# Altium footprint library IC.PcbLib: 386 footprints (part 11 of 30)
Each footprint in its own frame and in the unit in brackets; x right, y up, seen from the top. Pads: shape width x height; smd on the part's side, far side on the other; paste and mask are expansions set on the pad; w line width, h text height; cw(c..) or ccw(c..) is an arc to the next point about the centre after c.
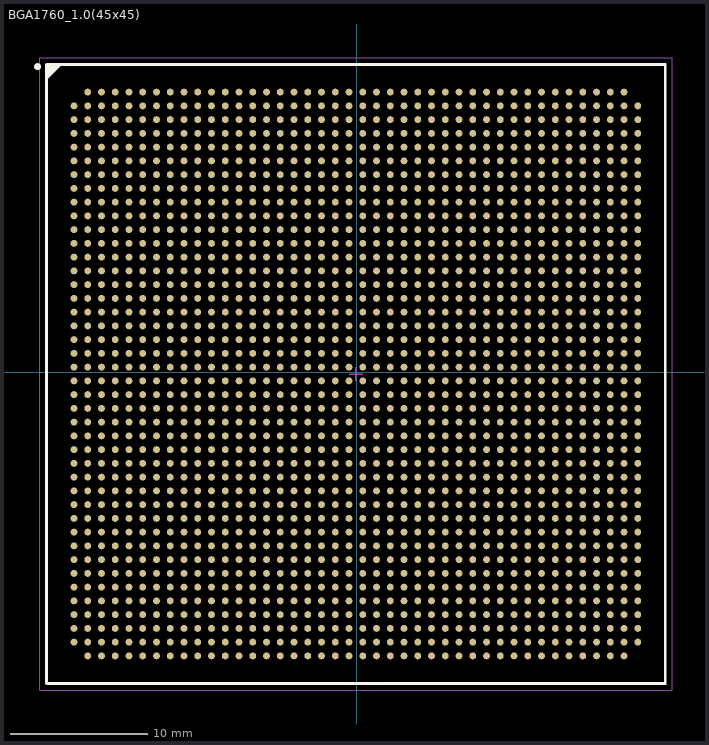
[diagram p10: the footprint, top view; thin cyan lines are the x and y axes]

## BGA1760_1.0(45x45) [mm]
height 0.65
pads (1760):
  round 0.5 smd: A2(-19.551,20.373) A3(-18.551,20.373) A4(-17.551,20.373) A5(-16.551,20.373) A6(-15.551,20.373) A7(-14.551,20.373) A8(-13.551,20.373) A9(-12.551,20.373) A10(-11.551,20.373) A11(-10.551,20.373) A12(-9.551,20.373) A13(-8.551,20.373) A14(-7.551,20.373) A15(-6.551,20.373) A16(-5.551,20.373) A17(-4.551,20.373) A18(-3.551,20.373) A19(-2.551,20.373) A20(-1.551,20.373) A21(-0.551,20.373) A22(0.449,20.373) A23(1.449,20.373) A24(2.449,20.373) A25(3.449,20.373) A26(4.449,20.373) A27(5.449,20.373) A28(6.449,20.373) A29(7.449,20.373) A30(8.449,20.373) A31(9.449,20.373) A32(10.449,20.373) A33(11.449,20.373) A34(12.449,20.373) A35(13.449,20.373) A36(14.449,20.373) A37(15.449,20.373) A38(16.449,20.373) A39(17.449,20.373) A40(18.449,20.373) A41(19.449,20.373) AA1(-20.551,0.373) AA2(-19.551,0.373) AA3(-18.551,0.373) AA4(-17.551,0.373) AA5(-16.551,0.373) AA6(-15.551,0.373) AA7(-14.551,0.373) AA8(-13.551,0.373) AA9(-12.551,0.373) AA10(-11.551,0.373) AA11(-10.551,0.373) AA12(-9.551,0.373) AA13(-8.551,0.373) AA14(-7.551,0.373) AA15(-6.551,0.373) AA16(-5.551,0.373) AA17(-4.551,0.373) AA18(-3.551,0.373) AA19(-2.551,0.373) AA20(-1.551,0.373) AA21(-0.551,0.373) AA22(0.449,0.373) AA23(1.449,0.373) AA24(2.449,0.373) AA25(3.449,0.373) AA26(4.449,0.373) AA27(5.449,0.373) AA28(6.449,0.373) AA29(7.449,0.373) AA30(8.449,0.373) AA31(9.449,0.373) AA32(10.449,0.373) AA33(11.449,0.373) AA34(12.449,0.373) AA35(13.449,0.373) AA36(14.449,0.373) AA37(15.449,0.373) AA38(16.449,0.373) AA39(17.449,0.373) AA40(18.449,0.373) AA41(19.449,0.373) AA42(20.449,0.373) AB1(-20.551,-0.627) AB2(-19.551,-0.627) AB3(-18.551,-0.627) AB4(-17.551,-0.627) AB5(-16.551,-0.627) AB6(-15.551,-0.627) AB7(-14.551,-0.627) AB8(-13.551,-0.627) AB9(-12.551,-0.627) AB10(-11.551,-0.627) AB11(-10.551,-0.627) AB12(-9.551,-0.627) AB13(-8.551,-0.627) AB14(-7.551,-0.627) AB15(-6.551,-0.627) AB16(-5.551,-0.627) AB17(-4.551,-0.627) AB18(-3.551,-0.627) AB19(-2.551,-0.627) AB20(-1.551,-0.627) AB21(-0.551,-0.627) AB22(0.449,-0.627) AB23(1.449,-0.627) AB24(2.449,-0.627) AB25(3.449,-0.627) AB26(4.449,-0.627) AB27(5.449,-0.627) AB28(6.449,-0.627) AB29(7.449,-0.627) AB30(8.449,-0.627) AB31(9.449,-0.627) AB32(10.449,-0.627) AB33(11.449,-0.627) AB34(12.449,-0.627) AB35(13.449,-0.627) AB36(14.449,-0.627) AB37(15.449,-0.627) AB38(16.449,-0.627) AB39(17.449,-0.627) AB40(18.449,-0.627) AB41(19.449,-0.627) AB42(20.449,-0.627) AC1(-20.551,-1.627) AC2(-19.551,-1.627) AC3(-18.551,-1.627) AC4(-17.551,-1.627) AC5(-16.551,-1.627) AC6(-15.551,-1.627) AC7(-14.551,-1.627) AC8(-13.551,-1.627) AC9(-12.551,-1.627) AC10(-11.551,-1.627) AC11(-10.551,-1.627) AC12(-9.551,-1.627) AC13(-8.551,-1.627) AC14(-7.551,-1.627) AC15(-6.551,-1.627) AC16(-5.551,-1.627) AC17(-4.551,-1.627) AC18(-3.551,-1.627) AC19(-2.551,-1.627) AC20(-1.551,-1.627) AC21(-0.551,-1.627) AC22(0.449,-1.627) AC23(1.449,-1.627) AC24(2.449,-1.627) AC25(3.449,-1.627) AC26(4.449,-1.627) AC27(5.449,-1.627) AC28(6.449,-1.627) AC29(7.449,-1.627) AC30(8.449,-1.627) AC31(9.449,-1.627) AC32(10.449,-1.627) AC33(11.449,-1.627) AC34(12.449,-1.627) AC35(13.449,-1.627) AC36(14.449,-1.627) AC37(15.449,-1.627) AC38(16.449,-1.627) AC39(17.449,-1.627) AC40(18.449,-1.627) AC41(19.449,-1.627) AC42(20.449,-1.627) AD1(-20.551,-2.627) AD2(-19.551,-2.627) AD3(-18.551,-2.627) AD4(-17.551,-2.627) AD5(-16.551,-2.627) AD6(-15.551,-2.627) AD7(-14.551,-2.627) AD8(-13.551,-2.627) AD9(-12.551,-2.627) AD10(-11.551,-2.627) AD11(-10.551,-2.627) AD12(-9.551,-2.627) AD13(-8.551,-2.627) AD14(-7.551,-2.627) AD15(-6.551,-2.627) AD16(-5.551,-2.627) AD17(-4.551,-2.627) AD18(-3.551,-2.627) AD19(-2.551,-2.627) AD20(-1.551,-2.627) AD21(-0.551,-2.627) AD22(0.449,-2.627) AD23(1.449,-2.627) AD24(2.449,-2.627) AD25(3.449,-2.627) AD26(4.449,-2.627) AD27(5.449,-2.627) AD28(6.449,-2.627) AD29(7.449,-2.627) AD30(8.449,-2.627) AD31(9.449,-2.627) AD32(10.449,-2.627) AD33(11.449,-2.627) AD34(12.449,-2.627) AD35(13.449,-2.627) AD36(14.449,-2.627) AD37(15.449,-2.627) AD38(16.449,-2.627) AD39(17.449,-2.627) AD40(18.449,-2.627) AD41(19.449,-2.627) AD42(20.449,-2.627) AE1(-20.551,-3.627) AE2(-19.551,-3.627) AE3(-18.551,-3.627) AE4(-17.551,-3.627) AE5(-16.551,-3.627) AE6(-15.551,-3.627) AE7(-14.551,-3.627) AE8(-13.551,-3.627) AE9(-12.551,-3.627) AE10(-11.551,-3.627) AE11(-10.551,-3.627) AE12(-9.551,-3.627) AE13(-8.551,-3.627) AE14(-7.551,-3.627) AE15(-6.551,-3.627) AE16(-5.551,-3.627) AE17(-4.551,-3.627) AE18(-3.551,-3.627) AE19(-2.551,-3.627) AE20(-1.551,-3.627) AE21(-0.551,-3.627) AE22(0.449,-3.627) AE23(1.449,-3.627) AE24(2.449,-3.627) AE25(3.449,-3.627) AE26(4.449,-3.627) AE27(5.449,-3.627) AE28(6.449,-3.627) AE29(7.449,-3.627) AE30(8.449,-3.627) AE31(9.449,-3.627) AE32(10.449,-3.627) AE33(11.449,-3.627) AE34(12.449,-3.627) AE35(13.449,-3.627) AE36(14.449,-3.627) AE37(15.449,-3.627) AE38(16.449,-3.627) AE39(17.449,-3.627) AE40(18.449,-3.627) AE41(19.449,-3.627) AE42(20.449,-3.627) AF1(-20.551,-4.627) AF2(-19.551,-4.627) AF3(-18.551,-4.627) AF4(-17.551,-4.627) AF5(-16.551,-4.627) AF6(-15.551,-4.627) AF7(-14.551,-4.627) AF8(-13.551,-4.627) AF9(-12.551,-4.627) AF10(-11.551,-4.627) AF11(-10.551,-4.627) AF12(-9.551,-4.627) AF13(-8.551,-4.627) AF14(-7.551,-4.627) AF15(-6.551,-4.627) AF16(-5.551,-4.627) AF17(-4.551,-4.627) AF18(-3.551,-4.627) AF19(-2.551,-4.627) AF20(-1.551,-4.627) AF21(-0.551,-4.627) AF22(0.449,-4.627) AF23(1.449,-4.627) AF24(2.449,-4.627) AF25(3.449,-4.627) AF26(4.449,-4.627) AF27(5.449,-4.627) AF28(6.449,-4.627) AF29(7.449,-4.627) AF30(8.449,-4.627) AF31(9.449,-4.627) AF32(10.449,-4.627) AF33(11.449,-4.627) AF34(12.449,-4.627) AF35(13.449,-4.627) AF36(14.449,-4.627) AF37(15.449,-4.627) AF38(16.449,-4.627) AF39(17.449,-4.627) AF40(18.449,-4.627) AF41(19.449,-4.627) AF42(20.449,-4.627) AG1(-20.551,-5.627) AG2(-19.551,-5.627) AG3(-18.551,-5.627) AG4(-17.551,-5.627) AG5(-16.551,-5.627) AG6(-15.551,-5.627) AG7(-14.551,-5.627) AG8(-13.551,-5.627) AG9(-12.551,-5.627) AG10(-11.551,-5.627) AG11(-10.551,-5.627) AG12(-9.551,-5.627) AG13(-8.551,-5.627) AG14(-7.551,-5.627) AG15(-6.551,-5.627) AG16(-5.551,-5.627) AG17(-4.551,-5.627) AG18(-3.551,-5.627) AG19(-2.551,-5.627) AG20(-1.551,-5.627) AG21(-0.551,-5.627) AG22(0.449,-5.627) AG23(1.449,-5.627) AG24(2.449,-5.627) AG25(3.449,-5.627) AG26(4.449,-5.627) AG27(5.449,-5.627) AG28(6.449,-5.627) AG29(7.449,-5.627) AG30(8.449,-5.627) AG31(9.449,-5.627) AG32(10.449,-5.627) AG33(11.449,-5.627) AG34(12.449,-5.627) AG35(13.449,-5.627) AG36(14.449,-5.627) AG37(15.449,-5.627) AG38(16.449,-5.627) AG39(17.449,-5.627) AG40(18.449,-5.627) AG41(19.449,-5.627) AG42(20.449,-5.627) AH1(-20.551,-6.627) AH2(-19.551,-6.627) AH3(-18.551,-6.627) AH4(-17.551,-6.627) AH5(-16.551,-6.627) AH6(-15.551,-6.627) AH7(-14.551,-6.627) AH8(-13.551,-6.627) AH9(-12.551,-6.627) AH10(-11.551,-6.627) AH11(-10.551,-6.627) AH12(-9.551,-6.627) AH13(-8.551,-6.627) AH14(-7.551,-6.627) AH15(-6.551,-6.627) AH16(-5.551,-6.627) AH17(-4.551,-6.627) AH18(-3.551,-6.627) AH19(-2.551,-6.627) AH20(-1.551,-6.627) AH21(-0.551,-6.627) AH22(0.449,-6.627) AH23(1.449,-6.627) AH24(2.449,-6.627) AH25(3.449,-6.627) AH26(4.449,-6.627) AH27(5.449,-6.627) AH28(6.449,-6.627) AH29(7.449,-6.627) AH30(8.449,-6.627) AH31(9.449,-6.627) AH32(10.449,-6.627) AH33(11.449,-6.627) AH34(12.449,-6.627) AH35(13.449,-6.627) AH36(14.449,-6.627) AH37(15.449,-6.627) AH38(16.449,-6.627) AH39(17.449,-6.627) AH40(18.449,-6.627) AH41(19.449,-6.627) AH42(20.449,-6.627) AJ1(-20.551,-7.627) AJ2(-19.551,-7.627) AJ3(-18.551,-7.627) AJ4(-17.551,-7.627) AJ5(-16.551,-7.627) AJ6(-15.551,-7.627) AJ7(-14.551,-7.627) AJ8(-13.551,-7.627) AJ9(-12.551,-7.627) AJ10(-11.551,-7.627) AJ11(-10.551,-7.627) AJ12(-9.551,-7.627) AJ13(-8.551,-7.627) AJ14(-7.551,-7.627) AJ15(-6.551,-7.627) AJ16(-5.551,-7.627) AJ17(-4.551,-7.627) AJ18(-3.551,-7.627) AJ19(-2.551,-7.627) AJ20(-1.551,-7.627) AJ21(-0.551,-7.627) AJ22(0.449,-7.627) AJ23(1.449,-7.627) AJ24(2.449,-7.627) AJ25(3.449,-7.627) AJ26(4.449,-7.627) AJ27(5.449,-7.627) AJ28(6.449,-7.627) AJ29(7.449,-7.627) AJ30(8.449,-7.627) AJ31(9.449,-7.627) AJ32(10.449,-7.627) AJ33(11.449,-7.627) AJ34(12.449,-7.627) AJ35(13.449,-7.627) AJ36(14.449,-7.627) AJ37(15.449,-7.627) AJ38(16.449,-7.627) AJ39(17.449,-7.627) AJ40(18.449,-7.627) AJ41(19.449,-7.627) AJ42(20.449,-7.627) AK1(-20.551,-8.627) AK2(-19.551,-8.627) AK3(-18.551,-8.627) AK4(-17.551,-8.627) AK5(-16.551,-8.627) AK6(-15.551,-8.627) AK7(-14.551,-8.627) AK8(-13.551,-8.627) AK9(-12.551,-8.627) AK10(-11.551,-8.627) AK11(-10.551,-8.627) AK12(-9.551,-8.627) AK13(-8.551,-8.627) AK14(-7.551,-8.627) AK15(-6.551,-8.627) AK16(-5.551,-8.627) AK17(-4.551,-8.627) AK18(-3.551,-8.627) AK19(-2.551,-8.627) AK20(-1.551,-8.627) AK21(-0.551,-8.627) AK22(0.449,-8.627) AK23(1.449,-8.627) AK24(2.449,-8.627) AK25(3.449,-8.627) AK26(4.449,-8.627) AK27(5.449,-8.627) AK28(6.449,-8.627) AK29(7.449,-8.627) AK30(8.449,-8.627) AK31(9.449,-8.627) AK32(10.449,-8.627) AK33(11.449,-8.627) AK34(12.449,-8.627) AK35(13.449,-8.627) AK36(14.449,-8.627) AK37(15.449,-8.627) AK38(16.449,-8.627) AK39(17.449,-8.627) AK40(18.449,-8.627) AK41(19.449,-8.627) AK42(20.449,-8.627) AL1(-20.551,-9.627) AL2(-19.551,-9.627) AL3(-18.551,-9.627) AL4(-17.551,-9.627) AL5(-16.551,-9.627) AL6(-15.551,-9.627) AL7(-14.551,-9.627) AL8(-13.551,-9.627) AL9(-12.551,-9.627) AL10(-11.551,-9.627) AL11(-10.551,-9.627) AL12(-9.551,-9.627) AL13(-8.551,-9.627) AL14(-7.551,-9.627) AL15(-6.551,-9.627) AL16(-5.551,-9.627) AL17(-4.551,-9.627) AL18(-3.551,-9.627) AL19(-2.551,-9.627) AL20(-1.551,-9.627) AL21(-0.551,-9.627) AL22(0.449,-9.627) AL23(1.449,-9.627) AL24(2.449,-9.627) AL25(3.449,-9.627) AL26(4.449,-9.627) AL27(5.449,-9.627) AL28(6.449,-9.627) AL29(7.449,-9.627) AL30(8.449,-9.627) AL31(9.449,-9.627) AL32(10.449,-9.627) AL33(11.449,-9.627) AL34(12.449,-9.627) AL35(13.449,-9.627) AL36(14.449,-9.627) AL37(15.449,-9.627) AL38(16.449,-9.627) AL39(17.449,-9.627) AL40(18.449,-9.627) AL41(19.449,-9.627) AL42(20.449,-9.627) AM1(-20.551,-10.627) AM2(-19.551,-10.627) AM3(-18.551,-10.627) AM4(-17.551,-10.627) AM5(-16.551,-10.627) AM6(-15.551,-10.627) AM7(-14.551,-10.627) AM8(-13.551,-10.627) AM9(-12.551,-10.627) AM10(-11.551,-10.627) AM11(-10.551,-10.627) AM12(-9.551,-10.627) AM13(-8.551,-10.627) AM14(-7.551,-10.627) AM15(-6.551,-10.627) AM16(-5.551,-10.627) AM17(-4.551,-10.627) AM18(-3.551,-10.627) AM19(-2.551,-10.627) AM20(-1.551,-10.627) AM21(-0.551,-10.627) AM22(0.449,-10.627) AM23(1.449,-10.627) AM24(2.449,-10.627) AM25(3.449,-10.627) AM26(4.449,-10.627) AM27(5.449,-10.627) AM28(6.449,-10.627) AM29(7.449,-10.627) AM30(8.449,-10.627) AM31(9.449,-10.627) AM32(10.449,-10.627) AM33(11.449,-10.627) AM34(12.449,-10.627) AM35(13.449,-10.627) AM36(14.449,-10.627) AM37(15.449,-10.627) AM38(16.449,-10.627) AM39(17.449,-10.627) AM40(18.449,-10.627) AM41(19.449,-10.627) AM42(20.449,-10.627) AN1(-20.551,-11.627) AN2(-19.551,-11.627) AN3(-18.551,-11.627) AN4(-17.551,-11.627) AN5(-16.551,-11.627) AN6(-15.551,-11.627) AN7(-14.551,-11.627) AN8(-13.551,-11.627) AN9(-12.551,-11.627) AN10(-11.551,-11.627) AN11(-10.551,-11.627) AN12(-9.551,-11.627) AN13(-8.551,-11.627) AN14(-7.551,-11.627) AN15(-6.551,-11.627) AN16(-5.551,-11.627) AN17(-4.551,-11.627) AN18(-3.551,-11.627) AN19(-2.551,-11.627) AN20(-1.551,-11.627) AN21(-0.551,-11.627) AN22(0.449,-11.627) AN23(1.449,-11.627) AN24(2.449,-11.627) AN25(3.449,-11.627) AN26(4.449,-11.627) AN27(5.449,-11.627) AN28(6.449,-11.627) AN29(7.449,-11.627) AN30(8.449,-11.627) AN31(9.449,-11.627) AN32(10.449,-11.627) AN33(11.449,-11.627) AN34(12.449,-11.627) AN35(13.449,-11.627) AN36(14.449,-11.627) AN37(15.449,-11.627) AN38(16.449,-11.627) AN39(17.449,-11.627) AN40(18.449,-11.627) AN41(19.449,-11.627) AN42(20.449,-11.627) AP1(-20.551,-12.627) AP2(-19.551,-12.627) AP3(-18.551,-12.627) AP4(-17.551,-12.627) AP5(-16.551,-12.627) AP6(-15.551,-12.627) AP7(-14.551,-12.627) AP8(-13.551,-12.627) AP9(-12.551,-12.627) AP10(-11.551,-12.627) AP11(-10.551,-12.627) AP12(-9.551,-12.627) AP13(-8.551,-12.627) AP14(-7.551,-12.627) AP15(-6.551,-12.627) AP16(-5.551,-12.627) AP17(-4.551,-12.627) AP18(-3.551,-12.627) AP19(-2.551,-12.627) AP20(-1.551,-12.627) AP21(-0.551,-12.627) AP22(0.449,-12.627) AP23(1.449,-12.627) AP24(2.449,-12.627) AP25(3.449,-12.627) AP26(4.449,-12.627) AP27(5.449,-12.627) AP28(6.449,-12.627) AP29(7.449,-12.627) AP30(8.449,-12.627) AP31(9.449,-12.627) AP32(10.449,-12.627) AP33(11.449,-12.627) AP34(12.449,-12.627) AP35(13.449,-12.627) AP36(14.449,-12.627) AP37(15.449,-12.627) AP38(16.449,-12.627) AP39(17.449,-12.627) AP40(18.449,-12.627) AP41(19.449,-12.627) AP42(20.449,-12.627) AR1(-20.551,-13.627) AR2(-19.551,-13.627) AR3(-18.551,-13.627) AR4(-17.551,-13.627) AR5(-16.551,-13.627) AR6(-15.551,-13.627) AR7(-14.551,-13.627) AR8(-13.551,-13.627) AR9(-12.551,-13.627) AR10(-11.551,-13.627) AR11(-10.551,-13.627) AR12(-9.551,-13.627) AR13(-8.551,-13.627) AR14(-7.551,-13.627) AR15(-6.551,-13.627) AR16(-5.551,-13.627) AR17(-4.551,-13.627) AR18(-3.551,-13.627) AR19(-2.551,-13.627) AR20(-1.551,-13.627) AR21(-0.551,-13.627) AR22(0.449,-13.627) AR23(1.449,-13.627) AR24(2.449,-13.627) AR25(3.449,-13.627) AR26(4.449,-13.627) AR27(5.449,-13.627) AR28(6.449,-13.627) AR29(7.449,-13.627) AR30(8.449,-13.627) AR31(9.449,-13.627) AR32(10.449,-13.627) AR33(11.449,-13.627) AR34(12.449,-13.627) AR35(13.449,-13.627) AR36(14.449,-13.627) AR37(15.449,-13.627) AR38(16.449,-13.627) AR39(17.449,-13.627) AR40(18.449,-13.627) AR41(19.449,-13.627) AR42(20.449,-13.627) AT1(-20.551,-14.627) AT2(-19.551,-14.627) AT3(-18.551,-14.627) AT4(-17.551,-14.627) AT5(-16.551,-14.627) AT6(-15.551,-14.627) AT7(-14.551,-14.627) AT8(-13.551,-14.627) AT9(-12.551,-14.627) AT10(-11.551,-14.627) AT11(-10.551,-14.627) AT12(-9.551,-14.627) AT13(-8.551,-14.627) AT14(-7.551,-14.627) AT15(-6.551,-14.627) AT16(-5.551,-14.627) AT17(-4.551,-14.627) AT18(-3.551,-14.627) AT19(-2.551,-14.627) AT20(-1.551,-14.627) AT21(-0.551,-14.627) AT22(0.449,-14.627) AT23(1.449,-14.627) AT24(2.449,-14.627) AT25(3.449,-14.627) AT26(4.449,-14.627) AT27(5.449,-14.627) AT28(6.449,-14.627) AT29(7.449,-14.627) AT30(8.449,-14.627) AT31(9.449,-14.627) AT32(10.449,-14.627) AT33(11.449,-14.627) AT34(12.449,-14.627) AT35(13.449,-14.627) AT36(14.449,-14.627) AT37(15.449,-14.627) AT38(16.449,-14.627) AT39(17.449,-14.627) AT40(18.449,-14.627) AT41(19.449,-14.627) AT42(20.449,-14.627) AU1(-20.551,-15.627) AU2(-19.551,-15.627) AU3(-18.551,-15.627) AU4(-17.551,-15.627) AU5(-16.551,-15.627) AU6(-15.551,-15.627) AU7(-14.551,-15.627) AU8(-13.551,-15.627) AU9(-12.551,-15.627) AU10(-11.551,-15.627) AU11(-10.551,-15.627) AU12(-9.551,-15.627) AU13(-8.551,-15.627) AU14(-7.551,-15.627) AU15(-6.551,-15.627) AU16(-5.551,-15.627) AU17(-4.551,-15.627) AU18(-3.551,-15.627) AU19(-2.551,-15.627) AU20(-1.551,-15.627) AU21(-0.551,-15.627) AU22(0.449,-15.627) AU23(1.449,-15.627) AU24(2.449,-15.627) AU25(3.449,-15.627) AU26(4.449,-15.627) AU27(5.449,-15.627) AU28(6.449,-15.627) AU29(7.449,-15.627) AU30(8.449,-15.627) AU31(9.449,-15.627) AU32(10.449,-15.627) AU33(11.449,-15.627) AU34(12.449,-15.627) AU35(13.449,-15.627) AU36(14.449,-15.627) AU37(15.449,-15.627) AU38(16.449,-15.627) AU39(17.449,-15.627) AU40(18.449,-15.627) AU41(19.449,-15.627) AU42(20.449,-15.627) AV1(-20.551,-16.627) AV2(-19.551,-16.627) AV3(-18.551,-16.627) AV4(-17.551,-16.627) AV5(-16.551,-16.627) AV6(-15.551,-16.627) AV7(-14.551,-16.627) AV8(-13.551,-16.627) AV9(-12.551,-16.627) AV10(-11.551,-16.627) AV11(-10.551,-16.627) AV12(-9.551,-16.627) AV13(-8.551,-16.627) AV14(-7.551,-16.627) AV15(-6.551,-16.627) AV16(-5.551,-16.627) AV17(-4.551,-16.627) AV18(-3.551,-16.627) AV19(-2.551,-16.627) AV20(-1.551,-16.627) AV21(-0.551,-16.627) AV22(0.449,-16.627) AV23(1.449,-16.627) AV24(2.449,-16.627) AV25(3.449,-16.627) AV26(4.449,-16.627) AV27(5.449,-16.627) AV28(6.449,-16.627) AV29(7.449,-16.627) AV30(8.449,-16.627) AV31(9.449,-16.627) AV32(10.449,-16.627) AV33(11.449,-16.627) AV34(12.449,-16.627) AV35(13.449,-16.627) AV36(14.449,-16.627) AV37(15.449,-16.627) AV38(16.449,-16.627) AV39(17.449,-16.627) AV40(18.449,-16.627) AV41(19.449,-16.627) AV42(20.449,-16.627) AW1(-20.551,-17.627) AW2(-19.551,-17.627) AW3(-18.551,-17.627) AW4(-17.551,-17.627) AW5(-16.551,-17.627) AW6(-15.551,-17.627) AW7(-14.551,-17.627) AW8(-13.551,-17.627) AW9(-12.551,-17.627) AW10(-11.551,-17.627) AW11(-10.551,-17.627) AW12(-9.551,-17.627) AW13(-8.551,-17.627) AW14(-7.551,-17.627) AW15(-6.551,-17.627) AW16(-5.551,-17.627) AW17(-4.551,-17.627) AW18(-3.551,-17.627) AW19(-2.551,-17.627) AW20(-1.551,-17.627) AW21(-0.551,-17.627) AW22(0.449,-17.627) AW23(1.449,-17.627) AW24(2.449,-17.627) AW25(3.449,-17.627) AW26(4.449,-17.627) AW27(5.449,-17.627) AW28(6.449,-17.627) AW29(7.449,-17.627) AW30(8.449,-17.627) AW31(9.449,-17.627) AW32(10.449,-17.627) AW33(11.449,-17.627) AW34(12.449,-17.627) AW35(13.449,-17.627) AW36(14.449,-17.627) AW37(15.449,-17.627) AW38(16.449,-17.627) AW39(17.449,-17.627) AW40(18.449,-17.627) AW41(19.449,-17.627) AW42(20.449,-17.627) AY1(-20.551,-18.627) AY2(-19.551,-18.627) AY3(-18.551,-18.627) AY4(-17.551,-18.627) AY5(-16.551,-18.627) AY6(-15.551,-18.627) AY7(-14.551,-18.627) AY8(-13.551,-18.627) AY9(-12.551,-18.627) AY10(-11.551,-18.627) AY11(-10.551,-18.627) AY12(-9.551,-18.627) AY13(-8.551,-18.627) AY14(-7.551,-18.627) AY15(-6.551,-18.627) AY16(-5.551,-18.627) AY17(-4.551,-18.627) AY18(-3.551,-18.627) AY19(-2.551,-18.627) AY20(-1.551,-18.627) AY21(-0.551,-18.627) AY22(0.449,-18.627) AY23(1.449,-18.627) AY24(2.449,-18.627) AY25(3.449,-18.627) AY26(4.449,-18.627) AY27(5.449,-18.627) AY28(6.449,-18.627) AY29(7.449,-18.627) AY30(8.449,-18.627) AY31(9.449,-18.627) AY32(10.449,-18.627) AY33(11.449,-18.627) AY34(12.449,-18.627) AY35(13.449,-18.627) AY36(14.449,-18.627) AY37(15.449,-18.627) AY38(16.449,-18.627) AY39(17.449,-18.627) AY40(18.449,-18.627) AY41(19.449,-18.627) AY42(20.449,-18.627) B1(-20.551,19.373) B2(-19.551,19.373) B3(-18.551,19.373) B4(-17.551,19.373) B5(-16.551,19.373) B6(-15.551,19.373) B7(-14.551,19.373) B8(-13.551,19.373) B9(-12.551,19.373) B10(-11.551,19.373) B11(-10.551,19.373) B12(-9.551,19.373) B13(-8.551,19.373) B14(-7.551,19.373) B15(-6.551,19.373) B16(-5.551,19.373) B17(-4.551,19.373) B18(-3.551,19.373) B19(-2.551,19.373) B20(-1.551,19.373) B21(-0.551,19.373) B22(0.449,19.373) B23(1.449,19.373) B24(2.449,19.373) B25(3.449,19.373) B26(4.449,19.373) B27(5.449,19.373) B28(6.449,19.373) B29(7.449,19.373) B30(8.449,19.373) B31(9.449,19.373) B32(10.449,19.373) B33(11.449,19.373) B34(12.449,19.373) B35(13.449,19.373) B36(14.449,19.373) B37(15.449,19.373) B38(16.449,19.373) B39(17.449,19.373) B40(18.449,19.373) B41(19.449,19.373) B42(20.449,19.373) BA1(-20.551,-19.627) BA2(-19.551,-19.627) BA3(-18.551,-19.627) BA4(-17.551,-19.627) BA5(-16.551,-19.627) BA6(-15.551,-19.627) BA7(-14.551,-19.627) BA8(-13.551,-19.627) BA9(-12.551,-19.627) BA10(-11.551,-19.627) BA11(-10.551,-19.627) BA12(-9.551,-19.627) BA13(-8.551,-19.627) BA14(-7.551,-19.627) BA15(-6.551,-19.627) BA16(-5.551,-19.627) BA17(-4.551,-19.627) BA18(-3.551,-19.627) BA19(-2.551,-19.627) BA20(-1.551,-19.627) BA21(-0.551,-19.627) BA22(0.449,-19.627) BA23(1.449,-19.627) BA24(2.449,-19.627) BA25(3.449,-19.627) BA26(4.449,-19.627) BA27(5.449,-19.627) BA28(6.449,-19.627) BA29(7.449,-19.627) BA30(8.449,-19.627) BA31(9.449,-19.627) BA32(10.449,-19.627) BA33(11.449,-19.627) BA34(12.449,-19.627) BA35(13.449,-19.627) BA36(14.449,-19.627) BA37(15.449,-19.627) BA38(16.449,-19.627) BA39(17.449,-19.627) BA40(18.449,-19.627) BA41(19.449,-19.627) BA42(20.449,-19.627) BB2(-19.551,-20.627) BB3(-18.551,-20.627) BB4(-17.551,-20.627) BB5(-16.551,-20.627) BB6(-15.551,-20.627) BB7(-14.551,-20.627) BB8(-13.551,-20.627) BB9(-12.551,-20.627) BB10(-11.551,-20.627) BB11(-10.551,-20.627) BB12(-9.551,-20.627) BB13(-8.551,-20.627) BB14(-7.551,-20.627) BB15(-6.551,-20.627) BB16(-5.551,-20.627) BB17(-4.551,-20.627) BB18(-3.551,-20.627) BB19(-2.551,-20.627) BB20(-1.551,-20.627) BB21(-0.551,-20.627) BB22(0.449,-20.627) BB23(1.449,-20.627) BB24(2.449,-20.627) BB25(3.449,-20.627) BB26(4.449,-20.627) BB27(5.449,-20.627) BB28(6.449,-20.627) BB29(7.449,-20.627) BB30(8.449,-20.627) BB31(9.449,-20.627) BB32(10.449,-20.627) BB33(11.449,-20.627) BB34(12.449,-20.627) BB35(13.449,-20.627) BB36(14.449,-20.627) BB37(15.449,-20.627) BB38(16.449,-20.627) BB39(17.449,-20.627) BB40(18.449,-20.627) BB41(19.449,-20.627) C1(-20.551,18.373) C2(-19.551,18.373) C3(-18.551,18.373) C4(-17.551,18.373) C5(-16.551,18.373) C6(-15.551,18.373) C7(-14.551,18.373) C8(-13.551,18.373) C9(-12.551,18.373) C10(-11.551,18.373) C11(-10.551,18.373) C12(-9.551,18.373) C13(-8.551,18.373) C14(-7.551,18.373) C15(-6.551,18.373) C16(-5.551,18.373) C17(-4.551,18.373) C18(-3.551,18.373) C19(-2.551,18.373) C20(-1.551,18.373) C21(-0.551,18.373) C22(0.449,18.373) C23(1.449,18.373) C24(2.449,18.373) C25(3.449,18.373) C26(4.449,18.373) C27(5.449,18.373) C28(6.449,18.373) C29(7.449,18.373) C30(8.449,18.373) C31(9.449,18.373) C32(10.449,18.373) C33(11.449,18.373) C34(12.449,18.373) C35(13.449,18.373) C36(14.449,18.373) C37(15.449,18.373) C38(16.449,18.373) C39(17.449,18.373) C40(18.449,18.373) C41(19.449,18.373) C42(20.449,18.373) D1(-20.551,17.373) D2(-19.551,17.373) D3(-18.551,17.373) D4(-17.551,17.373) D5(-16.551,17.373) D6(-15.551,17.373) D7(-14.551,17.373) D8(-13.551,17.373) D9(-12.551,17.373) D10(-11.551,17.373) D11(-10.551,17.373) D12(-9.551,17.373) D13(-8.551,17.373) D14(-7.551,17.373) D15(-6.551,17.373) D16(-5.551,17.373) D17(-4.551,17.373) D18(-3.551,17.373) D19(-2.551,17.373) D20(-1.551,17.373) D21(-0.551,17.373) D22(0.449,17.373) D23(1.449,17.373) D24(2.449,17.373) D25(3.449,17.373) D26(4.449,17.373) D27(5.449,17.373) D28(6.449,17.373) D29(7.449,17.373) D30(8.449,17.373) D31(9.449,17.373) D32(10.449,17.373) D33(11.449,17.373) D34(12.449,17.373) D35(13.449,17.373) D36(14.449,17.373) D37(15.449,17.373) D38(16.449,17.373) D39(17.449,17.373) D40(18.449,17.373) D41(19.449,17.373) D42(20.449,17.373) E1(-20.551,16.373) E2(-19.551,16.373) E3(-18.551,16.373) E4(-17.551,16.373) E5(-16.551,16.373) E6(-15.551,16.373) E7(-14.551,16.373) E8(-13.551,16.373) E9(-12.551,16.373) E10(-11.551,16.373) E11(-10.551,16.373) E12(-9.551,16.373) E13(-8.551,16.373) E14(-7.551,16.373) E15(-6.551,16.373) E16(-5.551,16.373) E17(-4.551,16.373) E18(-3.551,16.373) E19(-2.551,16.373) E20(-1.551,16.373) E21(-0.551,16.373) E22(0.449,16.373) E23(1.449,16.373) E24(2.449,16.373) E25(3.449,16.373) E26(4.449,16.373) E27(5.449,16.373) E28(6.449,16.373) E29(7.449,16.373) E30(8.449,16.373) E31(9.449,16.373) E32(10.449,16.373) E33(11.449,16.373) E34(12.449,16.373) E35(13.449,16.373) E36(14.449,16.373) E37(15.449,16.373) E38(16.449,16.373) E39(17.449,16.373) E40(18.449,16.373) E41(19.449,16.373) E42(20.449,16.373) F1(-20.551,15.373) F2(-19.551,15.373) F3(-18.551,15.373) F4(-17.551,15.373) F5(-16.551,15.373) F6(-15.551,15.373) F7(-14.551,15.373) F8(-13.551,15.373) F9(-12.551,15.373) F10(-11.551,15.373) F11(-10.551,15.373) F12(-9.551,15.373) F13(-8.551,15.373) F14(-7.551,15.373) F15(-6.551,15.373) F16(-5.551,15.373) F17(-4.551,15.373) F18(-3.551,15.373) F19(-2.551,15.373) F20(-1.551,15.373) F21(-0.551,15.373) F22(0.449,15.373) F23(1.449,15.373) F24(2.449,15.373) F25(3.449,15.373) F26(4.449,15.373) F27(5.449,15.373) F28(6.449,15.373) F29(7.449,15.373) F30(8.449,15.373) F31(9.449,15.373) F32(10.449,15.373) F33(11.449,15.373) F34(12.449,15.373) F35(13.449,15.373) F36(14.449,15.373) F37(15.449,15.373) F38(16.449,15.373) F39(17.449,15.373) F40(18.449,15.373) F41(19.449,15.373) F42(20.449,15.373) G1(-20.551,14.373) G2(-19.551,14.373) G3(-18.551,14.373) G4(-17.551,14.373) G5(-16.551,14.373) G6(-15.551,14.373) G7(-14.551,14.373) G8(-13.551,14.373) G9(-12.551,14.373) G10(-11.551,14.373) G11(-10.551,14.373) G12(-9.551,14.373) G13(-8.551,14.373) G14(-7.551,14.373) G15(-6.551,14.373) G16(-5.551,14.373) G17(-4.551,14.373) G18(-3.551,14.373) G19(-2.551,14.373) G20(-1.551,14.373) G21(-0.551,14.373) G22(0.449,14.373) G23(1.449,14.373) G24(2.449,14.373) G25(3.449,14.373) G26(4.449,14.373) G27(5.449,14.373) G28(6.449,14.373) G29(7.449,14.373) G30(8.449,14.373) G31(9.449,14.373) G32(10.449,14.373) G33(11.449,14.373) G34(12.449,14.373) G35(13.449,14.373) G36(14.449,14.373) G37(15.449,14.373) G38(16.449,14.373) G39(17.449,14.373) G40(18.449,14.373) G41(19.449,14.373) G42(20.449,14.373) H1(-20.551,13.373) H2(-19.551,13.373) H3(-18.551,13.373) H4(-17.551,13.373) H5(-16.551,13.373) H6(-15.551,13.373) H7(-14.551,13.373) H8(-13.551,13.373) H9(-12.551,13.373) H10(-11.551,13.373) H11(-10.551,13.373) H12(-9.551,13.373) H13(-8.551,13.373) H14(-7.551,13.373) H15(-6.551,13.373) H16(-5.551,13.373) H17(-4.551,13.373) H18(-3.551,13.373) H19(-2.551,13.373) H20(-1.551,13.373) H21(-0.551,13.373) H22(0.449,13.373) H23(1.449,13.373) H24(2.449,13.373) H25(3.449,13.373) H26(4.449,13.373) H27(5.449,13.373) H28(6.449,13.373) H29(7.449,13.373) H30(8.449,13.373) H31(9.449,13.373) H32(10.449,13.373) H33(11.449,13.373) H34(12.449,13.373) H35(13.449,13.373) H36(14.449,13.373) H37(15.449,13.373) H38(16.449,13.373) H39(17.449,13.373) H40(18.449,13.373) H41(19.449,13.373) H42(20.449,13.373) J1(-20.551,12.373) J2(-19.551,12.373) J3(-18.551,12.373) J4(-17.551,12.373) J5(-16.551,12.373) J6(-15.551,12.373) J7(-14.551,12.373) J8(-13.551,12.373) J9(-12.551,12.373) J10(-11.551,12.373) J11(-10.551,12.373) J12(-9.551,12.373) J13(-8.551,12.373) J14(-7.551,12.373) J15(-6.551,12.373) J16(-5.551,12.373) J17(-4.551,12.373) J18(-3.551,12.373) J19(-2.551,12.373) J20(-1.551,12.373) J21(-0.551,12.373) J22(0.449,12.373) J23(1.449,12.373) J24(2.449,12.373) J25(3.449,12.373) J26(4.449,12.373) J27(5.449,12.373) J28(6.449,12.373) J29(7.449,12.373) J30(8.449,12.373) J31(9.449,12.373) J32(10.449,12.373) J33(11.449,12.373) J34(12.449,12.373) J35(13.449,12.373) J36(14.449,12.373) J37(15.449,12.373) J38(16.449,12.373) J39(17.449,12.373) J40(18.449,12.373) J41(19.449,12.373) J42(20.449,12.373) K1(-20.551,11.373) K2(-19.551,11.373) K3(-18.551,11.373) K4(-17.551,11.373) K5(-16.551,11.373) K6(-15.551,11.373) K7(-14.551,11.373) K8(-13.551,11.373) K9(-12.551,11.373) K10(-11.551,11.373) K11(-10.551,11.373) K12(-9.551,11.373) K13(-8.551,11.373) K14(-7.551,11.373) K15(-6.551,11.373) K16(-5.551,11.373) K17(-4.551,11.373) K18(-3.551,11.373) K19(-2.551,11.373) K20(-1.551,11.373) K21(-0.551,11.373) K22(0.449,11.373) K23(1.449,11.373) K24(2.449,11.373) K25(3.449,11.373) K26(4.449,11.373) K27(5.449,11.373) K28(6.449,11.373) K29(7.449,11.373) K30(8.449,11.373) K31(9.449,11.373) K32(10.449,11.373) K33(11.449,11.373) K34(12.449,11.373) K35(13.449,11.373) K36(14.449,11.373) K37(15.449,11.373) K38(16.449,11.373) K39(17.449,11.373) K40(18.449,11.373) K41(19.449,11.373) K42(20.449,11.373) L1(-20.551,10.373) L2(-19.551,10.373) L3(-18.551,10.373) L4(-17.551,10.373) L5(-16.551,10.373) L6(-15.551,10.373) L7(-14.551,10.373) L8(-13.551,10.373) L9(-12.551,10.373) L10(-11.551,10.373) L11(-10.551,10.373) L12(-9.551,10.373) L13(-8.551,10.373) L14(-7.551,10.373) L15(-6.551,10.373) L16(-5.551,10.373) L17(-4.551,10.373) L18(-3.551,10.373) L19(-2.551,10.373) L20(-1.551,10.373) L21(-0.551,10.373) L22(0.449,10.373) L23(1.449,10.373) L24(2.449,10.373) L25(3.449,10.373) L26(4.449,10.373) L27(5.449,10.373) L28(6.449,10.373) L29(7.449,10.373) L30(8.449,10.373) L31(9.449,10.373) L32(10.449,10.373) L33(11.449,10.373) L34(12.449,10.373) L35(13.449,10.373) L36(14.449,10.373) L37(15.449,10.373) L38(16.449,10.373) L39(17.449,10.373) L40(18.449,10.373) L41(19.449,10.373) L42(20.449,10.373) M1(-20.551,9.373) M2(-19.551,9.373) M3(-18.551,9.373) M4(-17.551,9.373) M5(-16.551,9.373) M6(-15.551,9.373) M7(-14.551,9.373) M8(-13.551,9.373) M9(-12.551,9.373) M10(-11.551,9.373) M11(-10.551,9.373) M12(-9.551,9.373) M13(-8.551,9.373) M14(-7.551,9.373) M15(-6.551,9.373) M16(-5.551,9.373) M17(-4.551,9.373) M18(-3.551,9.373) M19(-2.551,9.373) M20(-1.551,9.373) M21(-0.551,9.373) M22(0.449,9.373) M23(1.449,9.373) M24(2.449,9.373) M25(3.449,9.373) M26(4.449,9.373) M27(5.449,9.373) M28(6.449,9.373) M29(7.449,9.373) M30(8.449,9.373) M31(9.449,9.373) M32(10.449,9.373) M33(11.449,9.373) M34(12.449,9.373) M35(13.449,9.373) M36(14.449,9.373) M37(15.449,9.373) M38(16.449,9.373) M39(17.449,9.373) M40(18.449,9.373) M41(19.449,9.373) M42(20.449,9.373) N1(-20.551,8.373) N2(-19.551,8.373) N3(-18.551,8.373) N4(-17.551,8.373) N5(-16.551,8.373) N6(-15.551,8.373) N7(-14.551,8.373) N8(-13.551,8.373) N9(-12.551,8.373) N10(-11.551,8.373) N11(-10.551,8.373) N12(-9.551,8.373) N13(-8.551,8.373) N14(-7.551,8.373) N15(-6.551,8.373) N16(-5.551,8.373) N17(-4.551,8.373) N18(-3.551,8.373) N19(-2.551,8.373) N20(-1.551,8.373) N21(-0.551,8.373) N22(0.449,8.373) N23(1.449,8.373) N24(2.449,8.373) N25(3.449,8.373) N26(4.449,8.373) N27(5.449,8.373) N28(6.449,8.373) N29(7.449,8.373) N30(8.449,8.373) N31(9.449,8.373) N32(10.449,8.373) N33(11.449,8.373) N34(12.449,8.373) N35(13.449,8.373) N36(14.449,8.373) N37(15.449,8.373) N38(16.449,8.373) N39(17.449,8.373) N40(18.449,8.373) N41(19.449,8.373) N42(20.449,8.373) P1(-20.551,7.373) P2(-19.551,7.373) P3(-18.551,7.373) P4(-17.551,7.373) P5(-16.551,7.373) P6(-15.551,7.373) P7(-14.551,7.373) P8(-13.551,7.373) P9(-12.551,7.373) P10(-11.551,7.373) P11(-10.551,7.373) P12(-9.551,7.373) P13(-8.551,7.373) P14(-7.551,7.373) P15(-6.551,7.373) P16(-5.551,7.373) P17(-4.551,7.373) P18(-3.551,7.373) P19(-2.551,7.373) P20(-1.551,7.373) P21(-0.551,7.373) P22(0.449,7.373) P23(1.449,7.373) P24(2.449,7.373) P25(3.449,7.373) P26(4.449,7.373) P27(5.449,7.373) P28(6.449,7.373) P29(7.449,7.373) P30(8.449,7.373) P31(9.449,7.373) P32(10.449,7.373) P33(11.449,7.373) P34(12.449,7.373) P35(13.449,7.373) P36(14.449,7.373) P37(15.449,7.373) P38(16.449,7.373) P39(17.449,7.373) P40(18.449,7.373) P41(19.449,7.373) P42(20.449,7.373) R1(-20.551,6.373) R2(-19.551,6.373) R3(-18.551,6.373) R4(-17.551,6.373) R5(-16.551,6.373) R6(-15.551,6.373) R7(-14.551,6.373) R8(-13.551,6.373) R9(-12.551,6.373) R10(-11.551,6.373) R11(-10.551,6.373) R12(-9.551,6.373) R13(-8.551,6.373) R14(-7.551,6.373) R15(-6.551,6.373) R16(-5.551,6.373) R17(-4.551,6.373) R18(-3.551,6.373) R19(-2.551,6.373) R20(-1.551,6.373) R21(-0.551,6.373) R22(0.449,6.373) R23(1.449,6.373) R24(2.449,6.373) R25(3.449,6.373) R26(4.449,6.373) R27(5.449,6.373) R28(6.449,6.373) R29(7.449,6.373) R30(8.449,6.373) R31(9.449,6.373) R32(10.449,6.373) R33(11.449,6.373) R34(12.449,6.373) R35(13.449,6.373) R36(14.449,6.373) R37(15.449,6.373) R38(16.449,6.373) R39(17.449,6.373) R40(18.449,6.373) R41(19.449,6.373) R42(20.449,6.373) T1(-20.551,5.373) T2(-19.551,5.373) T3(-18.551,5.373) T4(-17.551,5.373) T5(-16.551,5.373) T6(-15.551,5.373) T7(-14.551,5.373) T8(-13.551,5.373) T9(-12.551,5.373) T10(-11.551,5.373) T11(-10.551,5.373) T12(-9.551,5.373) T13(-8.551,5.373) T14(-7.551,5.373) T15(-6.551,5.373) T16(-5.551,5.373) T17(-4.551,5.373) T18(-3.551,5.373) T19(-2.551,5.373) T20(-1.551,5.373) T21(-0.551,5.373) T22(0.449,5.373) T23(1.449,5.373) T24(2.449,5.373) T25(3.449,5.373) T26(4.449,5.373) T27(5.449,5.373) T28(6.449,5.373) T29(7.449,5.373) T30(8.449,5.373) T31(9.449,5.373) T32(10.449,5.373) T33(11.449,5.373) T34(12.449,5.373) T35(13.449,5.373) T36(14.449,5.373) T37(15.449,5.373) T38(16.449,5.373) T39(17.449,5.373) T40(18.449,5.373) T41(19.449,5.373) T42(20.449,5.373) U1(-20.551,4.373) U2(-19.551,4.373) U3(-18.551,4.373) U4(-17.551,4.373) U5(-16.551,4.373) U6(-15.551,4.373) U7(-14.551,4.373) U8(-13.551,4.373) U9(-12.551,4.373) U10(-11.551,4.373) U11(-10.551,4.373) U12(-9.551,4.373) U13(-8.551,4.373) U14(-7.551,4.373) U15(-6.551,4.373) U16(-5.551,4.373) U17(-4.551,4.373) U18(-3.551,4.373) U19(-2.551,4.373) U20(-1.551,4.373) U21(-0.551,4.373) U22(0.449,4.373) U23(1.449,4.373) U24(2.449,4.373) U25(3.449,4.373) U26(4.449,4.373) U27(5.449,4.373) U28(6.449,4.373) U29(7.449,4.373) U30(8.449,4.373) U31(9.449,4.373) U32(10.449,4.373) U33(11.449,4.373) U34(12.449,4.373) U35(13.449,4.373) U36(14.449,4.373) U37(15.449,4.373) U38(16.449,4.373) U39(17.449,4.373) U40(18.449,4.373) U41(19.449,4.373) U42(20.449,4.373) V1(-20.551,3.373) V2(-19.551,3.373) V3(-18.551,3.373) V4(-17.551,3.373) V5(-16.551,3.373) V6(-15.551,3.373) V7(-14.551,3.373) V8(-13.551,3.373) V9(-12.551,3.373) V10(-11.551,3.373) V11(-10.551,3.373) V12(-9.551,3.373) V13(-8.551,3.373) V14(-7.551,3.373) V15(-6.551,3.373) V16(-5.551,3.373) V17(-4.551,3.373) V18(-3.551,3.373) V19(-2.551,3.373) V20(-1.551,3.373) V21(-0.551,3.373) V22(0.449,3.373) V23(1.449,3.373) V24(2.449,3.373) V25(3.449,3.373) V26(4.449,3.373) V27(5.449,3.373) V28(6.449,3.373) V29(7.449,3.373) V30(8.449,3.373) V31(9.449,3.373) V32(10.449,3.373) V33(11.449,3.373) V34(12.449,3.373) V35(13.449,3.373) V36(14.449,3.373) V37(15.449,3.373) V38(16.449,3.373) V39(17.449,3.373) V40(18.449,3.373) V41(19.449,3.373) V42(20.449,3.373) W1(-20.551,2.373) W2(-19.551,2.373) W3(-18.551,2.373) W4(-17.551,2.373) W5(-16.551,2.373) W6(-15.551,2.373) W7(-14.551,2.373) W8(-13.551,2.373) W9(-12.551,2.373) W10(-11.551,2.373) W11(-10.551,2.373) W12(-9.551,2.373) W13(-8.551,2.373) W14(-7.551,2.373) W15(-6.551,2.373) W16(-5.551,2.373) W17(-4.551,2.373) W18(-3.551,2.373) W19(-2.551,2.373) W20(-1.551,2.373) W21(-0.551,2.373) W22(0.449,2.373) W23(1.449,2.373) W24(2.449,2.373) W25(3.449,2.373) W26(4.449,2.373) W27(5.449,2.373) W28(6.449,2.373) W29(7.449,2.373) W30(8.449,2.373) W31(9.449,2.373) W32(10.449,2.373) W33(11.449,2.373) W34(12.449,2.373) W35(13.449,2.373) W36(14.449,2.373) W37(15.449,2.373) W38(16.449,2.373) W39(17.449,2.373) W40(18.449,2.373) W41(19.449,2.373) W42(20.449,2.373) Y1(-20.551,1.373) Y2(-19.551,1.373) Y3(-18.551,1.373) Y4(-17.551,1.373) Y5(-16.551,1.373) Y6(-15.551,1.373) Y7(-14.551,1.373) Y8(-13.551,1.373) Y9(-12.551,1.373) Y10(-11.551,1.373) Y11(-10.551,1.373) Y12(-9.551,1.373) Y13(-8.551,1.373) Y14(-7.551,1.373) Y15(-6.551,1.373) Y16(-5.551,1.373) Y17(-4.551,1.373) Y18(-3.551,1.373) Y19(-2.551,1.373) Y20(-1.551,1.373) Y21(-0.551,1.373) Y22(0.449,1.373) Y23(1.449,1.373) Y24(2.449,1.373) Y25(3.449,1.373) Y26(4.449,1.373) Y27(5.449,1.373) Y28(6.449,1.373) Y29(7.449,1.373) Y30(8.449,1.373) Y31(9.449,1.373) Y32(10.449,1.373) Y33(11.449,1.373) Y34(12.449,1.373) Y35(13.449,1.373) Y36(14.449,1.373) Y37(15.449,1.373) Y38(16.449,1.373) Y39(17.449,1.373) Y40(18.449,1.373) Y41(19.449,1.373) Y42(20.449,1.373)
Top Overlay:
  circle w0.25: c-23.201,22.223 r0.125
  region: -21.551,22.373 -22.551,21.373 -22.551,22.373
  lines w0.2: -22.551,21.373 -21.551,22.373 ; -22.551,-22.627 -22.551,22.373 22.449,22.373 22.449,-22.627 -22.551,-22.627
Mechanical 13:
  lines w0.1: -22.551,-22.627 -22.551,22.373 22.449,22.373 22.449,-22.627 -22.551,-22.627
Mechanical 15:
  lines w0.05: -23.051,-23.127 -23.051,22.873 22.949,22.873 22.949,-23.127 -23.051,-23.127
  lines w0.1: -0.551,-0.127 0.449,-0.127 ; -0.051,-0.627 -0.051,0.373
3D body "BGA1760C100P42X42_4500X4500X335.step": height 3.35, standoff 0, extent -22.602,-22.652 22.398,22.348